# Altium footprint library ICgeneral.PCBLIB: 48 footprints (part 3 of 3)
Each footprint in its own frame and in the unit in brackets; x right, y up, seen from the top. Pads: shape width x height; smd on the part's side, far side on the other; paste and mask are expansions set on the pad; w line width, h text height; cw(c..) or ccw(c..) is an arc to the next point about the centre after c.
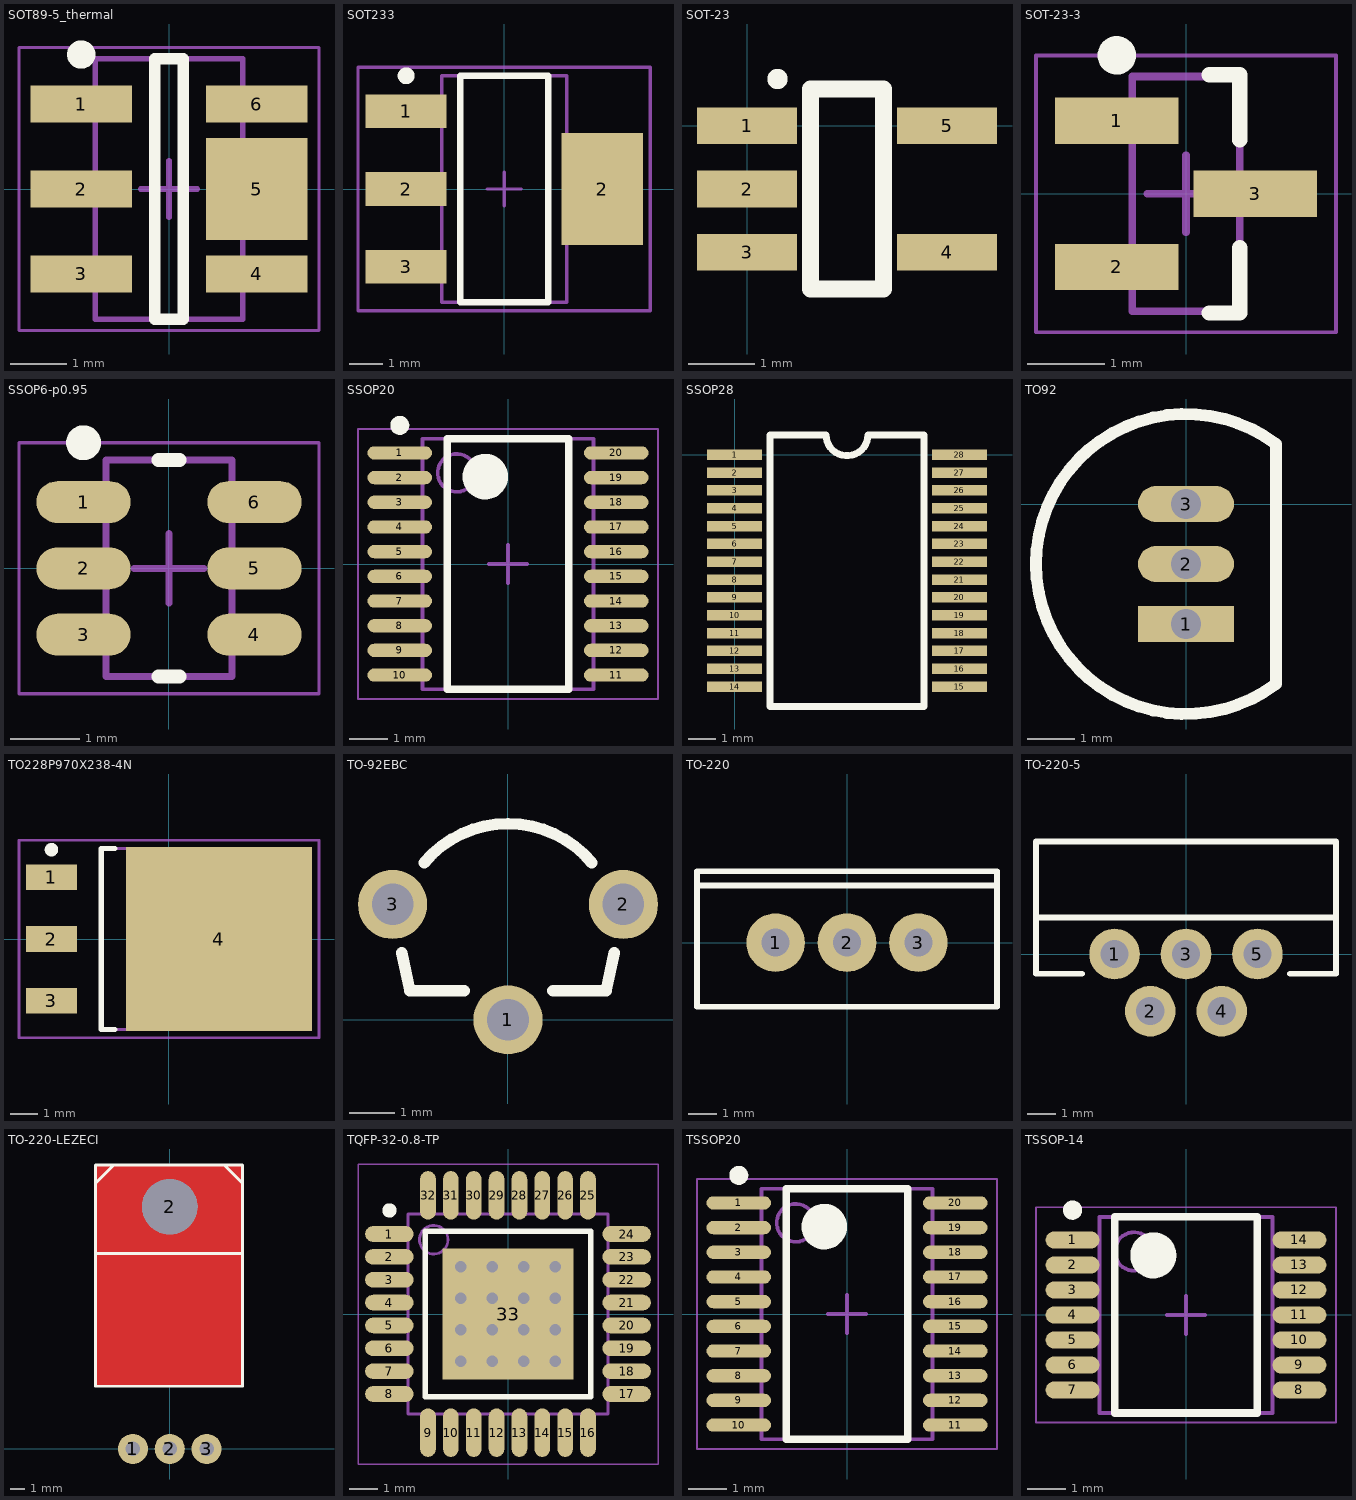
[diagram p2: the footprints below, top view; thin cyan lines are the x and y axes]

## SOT89-5_thermal [mm] "SOT89-5, 5-Leads + thermal pad, Body 4.50x4.09mm, Pitch 1.50mm, IPC Low Density"
height 1.6
pads (6):
  rect 1.8x0.65 smd: 1(-1.55,1.5) 2(-1.55,0) 3(-1.55,-1.5) 4(1.55,-1.5) 6(1.55,1.5)
  rect 1.8x1.8 smd: 5(1.55,0)
Top Overlay:
  circle w0.25: c-1.55,2.375 r0.125
  lines w0.2: -0.25,-2.3 0.25,-2.3 0.25,2.3 -0.25,2.3 -0.25,-2.3
Top Body, 3D Models:
  lines w0.1: -1.3,-2.3 -1.3,2.3 1.3,2.3 1.3,-2.3 -1.3,-2.3
Courtyard Top:
  lines w0.05: -2.65,-2.5 -2.65,2.5 2.65,2.5 2.65,-2.5 -2.65,-2.5
  lines w0.1: -0.5,0 0.5,0 ; 0,-0.5 0,0.5
Top DesignatorDoc:
  text ".Designator" at 0,0 h1.5
3D body "SOT89-5_thermal.step": height 1.6, standoff 0, extent -2.047,-2.298 2.047,2.298

## SOT233 [mm] "SOT223, 4-Leads, Body 6,7x7,3mm (max), Pitch 2,30mm, IPC Medium Density"
height 1.8
pads (4):
  rect 2.4x1 smd: 1(-2.9,2.3) 2(-2.9,0) 3(-2.9,-2.3)
  rect 2.4x3.3 smd: 2(2.9,0)
Top Overlay:
  circle w0.25: c-2.9,3.35 r0.125
  lines w0.2: -1.3,-3.35 -1.3,3.35 1.3,3.35 1.3,-3.35 -1.3,-3.35
Top Body, 3D Models:
  lines w0.1: -1.85,-3.35 -1.85,3.35 1.85,3.35 1.85,-3.35 -1.85,-3.35
Courtyard Top:
  lines w0.1: -0.5,0 0.5,0 ; 0,-0.5 0,0.5 ; -4.325,-3.6 -4.325,3.6 4.325,3.6 4.325,-3.6 -4.325,-3.6
Top DesignatorDoc:
  text ".Designator" at 0,0 h1.5
3D body: height 1.8, standoff 0.02, extent -1.85,-3.35 1.85,3.35

## SOT-23 [mm]
pads (5):
  rect 1.5x0.55 smd: 1(0,0) 2(0,-0.95) 3(0,-1.9) 4(3,-1.9) 5(3,0)
Top Overlay:
  circle w0.254: c0.459,0.701 r0.025
  lines w0.254: 0.95,-2.45 2.05,-2.45 2.05,0.55 1.5,0.55 0.95,0.55 0.95,-2.45
Top DesignatorDoc:
  text ".Designator" at 1.397,-1.016 h1.5
3D body "CircuitWorks-SOT-23.step": height 1.12, standoff 0.02, extent 0.274,-2.465 2.774,0.535

## SOT-23-3 [mm] "SOT23, 3-Leads, Body 2.86x2.37mm, Pitch 0.95mm, IPC Medium Density"
height 1.12
pads (3):
  rect 1.6x0.6 smd: 1(-0.9,0.95) 2(-0.9,-0.95) 3(0.9,0)
Top Overlay:
  circle w0.25: c-0.9,1.8 r0.125
  lines w0.2: 0.3,-1.55 0.7,-1.55 0.7,-0.7 ; 0.3,1.55 0.7,1.55 0.7,0.7
Top Body, 3D Models:
  lines w0.1: -0.7,-1.525 0.7,-1.525 0.7,1.525 -0.7,1.525 -0.7,-1.525
Courtyard Top:
  lines w0.05: -1.95,-1.8 1.95,-1.8 1.95,1.8 -1.95,1.8 -1.95,-1.8
  lines w0.1: -0.5,0 0.5,0 ; 0,-0.5 0,0.5
Top DesignatorDoc:
  text ".Designator" at 0,0 h1.5
3D body "CircuitWorks-SOT-23.step": height 1.12, standoff 0.02, extent -1.225,-1.474 1.275,1.526

## SSOP6-p0.95 [mm]
height 1.25
pads (6):
  oval 1.35x0.6 smd: 1(-1.225,0.95) 2(-1.225,0) 3(-1.225,-0.95) 4(1.225,-0.95) 5(1.225,0) 6(1.225,0.95)
Top Overlay:
  circle w0.25: c-1.225,1.8 r0.125
  lines w0.2: -0.15,-1.55 0.15,-1.55 ; -0.15,1.55 0.15,1.55
Top Body, 3D Models:
  lines w0.1: -0.9,-1.55 -0.9,1.55 0.9,1.55 0.9,-1.55 -0.9,-1.55
Courtyard Top:
  lines w0.05: -2.15,-1.8 -2.15,1.8 2.15,1.8 2.15,-1.8 -2.15,-1.8
  lines w0.1: -0.5,0 0.5,0 ; 0,-0.5 0,0.5
Top DesignatorDoc:
  text ".Designator" at 0,0 h1.5
3D body: height 1.25, standoff 0.1, extent -0.9,-1.55 0.9,1.55

## SSOP20 [mm] "TSOP, 20-Leads, Body 6.50x4.40mm, Pitch 0.65mm, IPC Medium Density"
height 1.5
pads (20):
  oval 1.7x0.35 smd: 1(-2.85,2.925) 2(-2.85,2.275) 3(-2.85,1.625) 4(-2.85,0.975) 5(-2.85,0.325) 6(-2.85,-0.325) 7(-2.85,-0.975) 8(-2.85,-1.625) 9(-2.85,-2.275) 10(-2.85,-2.925) 11(2.85,-2.925) 12(2.85,-2.275) 13(2.85,-1.625) 14(2.85,-0.975) 15(2.85,-0.325) 16(2.85,0.325) 17(2.85,0.975) 18(2.85,1.625) 19(2.85,2.275) 20(2.85,2.925)
Top Overlay:
  circle w0.6: c-0.6,2.3 r0.3
  circle w0.25: c-2.85,3.65 r0.125
  lines w0.2: -1.6,-3.3 1.6,-3.3 1.6,3.3 -1.6,3.3 -1.6,-3.3
Top Body, 3D Models:
  circle w0.1: c-1.35,2.4 r0.5
  lines w0.1: -2.25,-3.3 2.25,-3.3 2.25,3.3 -2.25,3.3 -2.25,-3.3
Courtyard Top:
  lines w0.05: -3.95,-3.55 3.95,-3.55 3.95,3.55 -3.95,3.55 -3.95,-3.55
  lines w0.1: -0.5,0 0.5,0 ; 0,-0.5 0,0.5
Top DesignatorDoc:
  text ".Designator" at 0,0 h1.5
3D body "User Library-TSSOP20_TP.STEP": height 1.1, standoff -0.09, extent -3.115,-3.35 3.165,3.15

## SSOP28 [mm]
pads (28):
  rect 2x0.38 smd: 1(0,0) 2(0,-0.65) 3(0,-1.3) 4(0,-1.95) 5(0,-2.6) 6(0,-3.25) 7(0,-3.9) 8(0,-4.55) 9(0,-5.2) 10(0,-5.85) 11(0,-6.5) 12(0,-7.15) 13(0,-7.8) 14(0,-8.45) 15(8.2,-8.45) 16(8.2,-7.8) 17(8.2,-7.15) 18(8.2,-6.5) 19(8.2,-5.85) 20(8.2,-5.2) 21(8.2,-4.55) 22(8.2,-3.9) 23(8.2,-3.25) 24(8.2,-2.6) 25(8.2,-1.95) 26(8.2,-1.3) 27(8.2,-0.65) 28(8.2,0)
Top Overlay:
  lines w0.254: 1.3,-9.175 6.9,-9.175 6.9,0.725 4.862,0.725 cw(c4.1,0.725) 3.338,0.725 1.3,0.725 1.3,-9.175
Top DesignatorDoc:
  text ".Designator" at 4.064,-4.445 h1.5

## TO92 [mil]
pads (3):
  rect 80x30 hole 25: 1(0,-100)
  oval 80x30 hole 25: 2(0,-50) 3(0,0)
Top Overlay:
  lines w10: 75,-150 cw(c0,-50) 75,50 75,-150
Top DesignatorDoc:
  text ".Designator" at 0,-50 h59.06
3D body "User Library-TO-92.step": height 205.33, standoff -428.78, extent -122.37,-172.05 67,72.05

## TO228P970X238-4N [mm] "D-PAK, 4-Pads, Body 6.2x6.7mm (max), IPC Medium Density"
height 2.38
pads (4):
  rect 1.9x0.95 smd: 1(-4.35,2.28) 2(-4.35,0) 3(-4.35,-2.28)
  rect 6.9x6.8 smd: 4(1.85,0)
Top Overlay:
  circle w0.25: c-4.35,3.305 r0.125
  lines w0.2: -2,-3.35 -2.5,-3.35 -2.5,3.35 -2,3.35
Top Body, 3D Models:
  lines w0.1: -2.5,-3.35 -2.5,3.35 3.7,3.35 3.7,-3.35 -2.5,-3.35
Courtyard Top:
  lines w0.1: -0.5,0 0.5,0 ; 0,-0.5 0,0.5 ; -5.55,-3.65 -5.55,3.65 5.55,3.65 5.55,-3.65 -5.55,-3.65
Top DesignatorDoc:
  text ".Designator" at -3.175,0 h1.5
3D body: height 2.38, standoff 0, extent -2.5,-3.35 3.7,3.35

## TO-92EBC [mil]
pads (3):
  round 60 hole 36: 1(0,0) 2(100,100) 3(-100,100)
Top Overlay:
  lines w10: -92,58 -85,25 -38,25 ; -72.77,136.07 cw(c0,75) 72.77,136.07 ; 39,25 85,25 92,58
Top DesignatorDoc:
  text ".Designator" at 0,50 h59.06

## TO-220 [mil]
pads (3):
  round 82 hole 39.37: 1(-100,0) 2(0,0) 3(100,0)
Top Overlay:
  lines w8: -210,80 210,80 ; -210,-90 -210,100 210,100 210,-90 -210,-90
Top DesignatorDoc:
  text ".Designator" at 0,0 h59.06

## TO-220-5 [mm]
pads (5):
  round 1.8 hole 1: 1(-2.54,0) 2(-1.27,-2.032) 3(0,0) 4(1.27,-2.032) 5(2.54,0)
Top Overlay:
  lines w0.203: -5.334,1.3 5.334,1.3 ; -3.7,-0.7 -5.334,-0.7 -5.334,4 5.334,4 5.334,-0.7 3.7,-0.7
Top DesignatorDoc:
  text ".Designator" at 0,1.905 h1.5

## TO-220-LEZECI [mil]
pads (4):
  round 82 hole 39.37: 1(-100,0) 2(0,0) 3(100,0)
  round 150 hole 150: 2(0,656.93)
Top Layer:
  rectangle: -201,170 197,769
Top Overlay:
  lines w8: -202,530 198,530 ; -202,720 -152,770 ; 148,770 198,720 ; -202,170 198,170 198,770 -202,770 -202,170
Top Solder:
  rectangle: -207,166 203,773
Top DesignatorDoc:
  text ".Designator" at 0,50 h59.06
3D body "User Library-TO220 L.step": height 177.17, standoff -118.11, extent -197.85,-8 195.85,767.76

## TQFP-32-0.8-TP [mm] "TQFP, 32-Leads, Body 7.00x7.00mm, Pitch 0.80mm, Thermal Pad 4.60x4.60mm, IPC Medium Density"
height 1.45
pads (33):
  oval 1.7x0.55 smd: 1(-4.15,2.8) 2(-4.15,2) 3(-4.15,1.2) 4(-4.15,0.4) 5(-4.15,-0.4) 6(-4.15,-1.2) 7(-4.15,-2) 8(-4.15,-2.8) 17(4.15,-2.8) 18(4.15,-2) 19(4.15,-1.2) 20(4.15,-0.4) 21(4.15,0.4) 22(4.15,1.2) 23(4.15,2) 24(4.15,2.8)
  oval 0.55x1.7 smd: 9(-2.8,-4.15) 10(-2,-4.15) 11(-1.2,-4.15) 12(-0.4,-4.15) 13(0.4,-4.15) 14(1.2,-4.15) 15(2,-4.15) 16(2.8,-4.15) 25(2.8,4.15) 26(2,4.15) 27(1.2,4.15) 28(0.4,4.15) 29(-0.4,4.15) 30(-1.2,4.15) 31(-2,4.15) 32(-2.8,4.15)
  rect 4.6x4.6 smd: 33(0,0)
via 1.65,-1.65 diameter 0.7 hole 0.4
via 0.55,-1.65 diameter 0.7 hole 0.4
via -0.55,-1.65 diameter 0.7 hole 0.4
via -1.65,-1.65 diameter 0.7 hole 0.4
via 1.65,-0.55 diameter 0.7 hole 0.4
via 0.55,-0.55 diameter 0.7 hole 0.4
via -0.55,-0.55 diameter 0.7 hole 0.4
via -1.65,-0.55 diameter 0.7 hole 0.4
via 1.65,0.55 diameter 0.7 hole 0.4
via 0.55,0.55 diameter 0.7 hole 0.4
via -0.55,0.55 diameter 0.7 hole 0.4
via -1.65,0.55 diameter 0.7 hole 0.4
via 1.65,1.65 diameter 0.7 hole 0.4
via 0.55,1.65 diameter 0.7 hole 0.4
via -0.55,1.65 diameter 0.7 hole 0.4
via -1.65,1.65 diameter 0.7 hole 0.4
Top Overlay:
  circle w0.25: c-4.15,3.625 r0.125
  lines w0.2: -2.9,-2.9 2.9,-2.9 2.9,2.9 -2.9,2.9 -2.9,-2.9
Top Body, 3D Models:
  circle w0.1: c-2.6,2.6 r0.5
  lines w0.1: -3.5,-3.5 3.5,-3.5 3.5,3.5 -3.5,3.5 -3.5,-3.5
Courtyard Top:
  lines w0.05: -5.25,-5.25 5.25,-5.25 5.25,5.25 -5.25,5.25 -5.25,-5.25
  lines w0.1: -0.5,0 0.5,0 ; 0,-0.5 0,0.5
Top DesignatorDoc:
  text ".Designator" at 0,0 h1.5
3D body "User Library-tqfp32.step": height 1.2, standoff 0, extent -4.6,-4.599 4.599,4.599

## TSSOP20 [mm]
height 1.1
pads (20):
  oval 1.7x0.35 smd: 1(-2.85,2.925) 2(-2.85,2.275) 3(-2.85,1.625) 4(-2.85,0.975) 5(-2.85,0.325) 6(-2.85,-0.325) 7(-2.85,-0.975) 8(-2.85,-1.625) 9(-2.85,-2.275) 10(-2.85,-2.925) 11(2.85,-2.925) 12(2.85,-2.275) 13(2.85,-1.625) 14(2.85,-0.975) 15(2.85,-0.325) 16(2.85,0.325) 17(2.85,0.975) 18(2.85,1.625) 19(2.85,2.275) 20(2.85,2.925)
Top Overlay:
  circle w0.25: c-2.85,3.65 r0.125
  circle w0.6: c-0.6,2.3 r0.3
  lines w0.2: -1.6,-3.3 -1.6,3.3 1.6,3.3 1.6,-3.3 -1.6,-3.3
Top Body, 3D Models:
  circle w0.1: c-1.35,2.4 r0.5
  lines w0.1: -2.25,-3.3 -2.25,3.3 2.25,3.3 2.25,-3.3 -2.25,-3.3
Courtyard Top:
  lines w0.05: -3.95,-3.55 -3.95,3.55 3.95,3.55 3.95,-3.55 -3.95,-3.55
  lines w0.1: -0.5,0 0.5,0 ; 0,-0.5 0,0.5
Top DesignatorDoc:
  text ".Designator" at 0,0 h1.5
3D body "User Library-TSSOP20_TP.STEP": height 1.1, standoff -0.09, extent -3.115,-3.35 3.165,3.15

## TSSOP-14 [mm] "TSOP, 14-Leads, Body 5.00x4.40mm, Pitch 0.65mm, IPC Medium Density"
height 1.2
pads (14):
  oval 1.4x0.45 smd: 1(-2.95,1.95) 2(-2.95,1.3) 3(-2.95,0.65) 4(-2.95,0) 5(-2.95,-0.65) 6(-2.95,-1.3) 7(-2.95,-1.95) 8(2.95,-1.95) 9(2.95,-1.3) 10(2.95,-0.65) 11(2.95,0) 12(2.95,0.65) 13(2.95,1.3) 14(2.95,1.95)
Top Overlay:
  circle w0.25: c-2.95,2.725 r0.125
  circle w0.6: c-0.85,1.55 r0.3
  lines w0.2: -1.85,-2.55 -1.85,2.55 1.85,2.55 1.85,-2.55 -1.85,-2.55
Top Body, 3D Models:
  circle w0.1: c-1.35,1.65 r0.5
  lines w0.1: -2.25,-2.55 -2.25,2.55 2.25,2.55 2.25,-2.55 -2.25,-2.55
Courtyard Top:
  lines w0.05: -3.9,-2.8 -3.9,2.8 3.9,2.8 3.9,-2.8 -3.9,-2.8
  lines w0.1: -0.5,0 0.5,0 ; 0,-0.5 0,0.5
Top DesignatorDoc:
  text ".Designator" at 0,0 h1.5
3D body "User Library-tssop14-2.step": height 1.2, standoff 0, extent -3.2,-2.55 3.2,2.55